# Altium footprint library Toi Library.PcbLib: 740 footprints (part 41 of 47)
Each footprint in its own frame and in the unit in brackets; x right, y up, seen from the top. Pads: shape width x height; smd on the part's side, far side on the other; paste and mask are expansions set on the pad; w line width, h text height; cw(c..) or ccw(c..) is an arc to the next point about the centre after c.
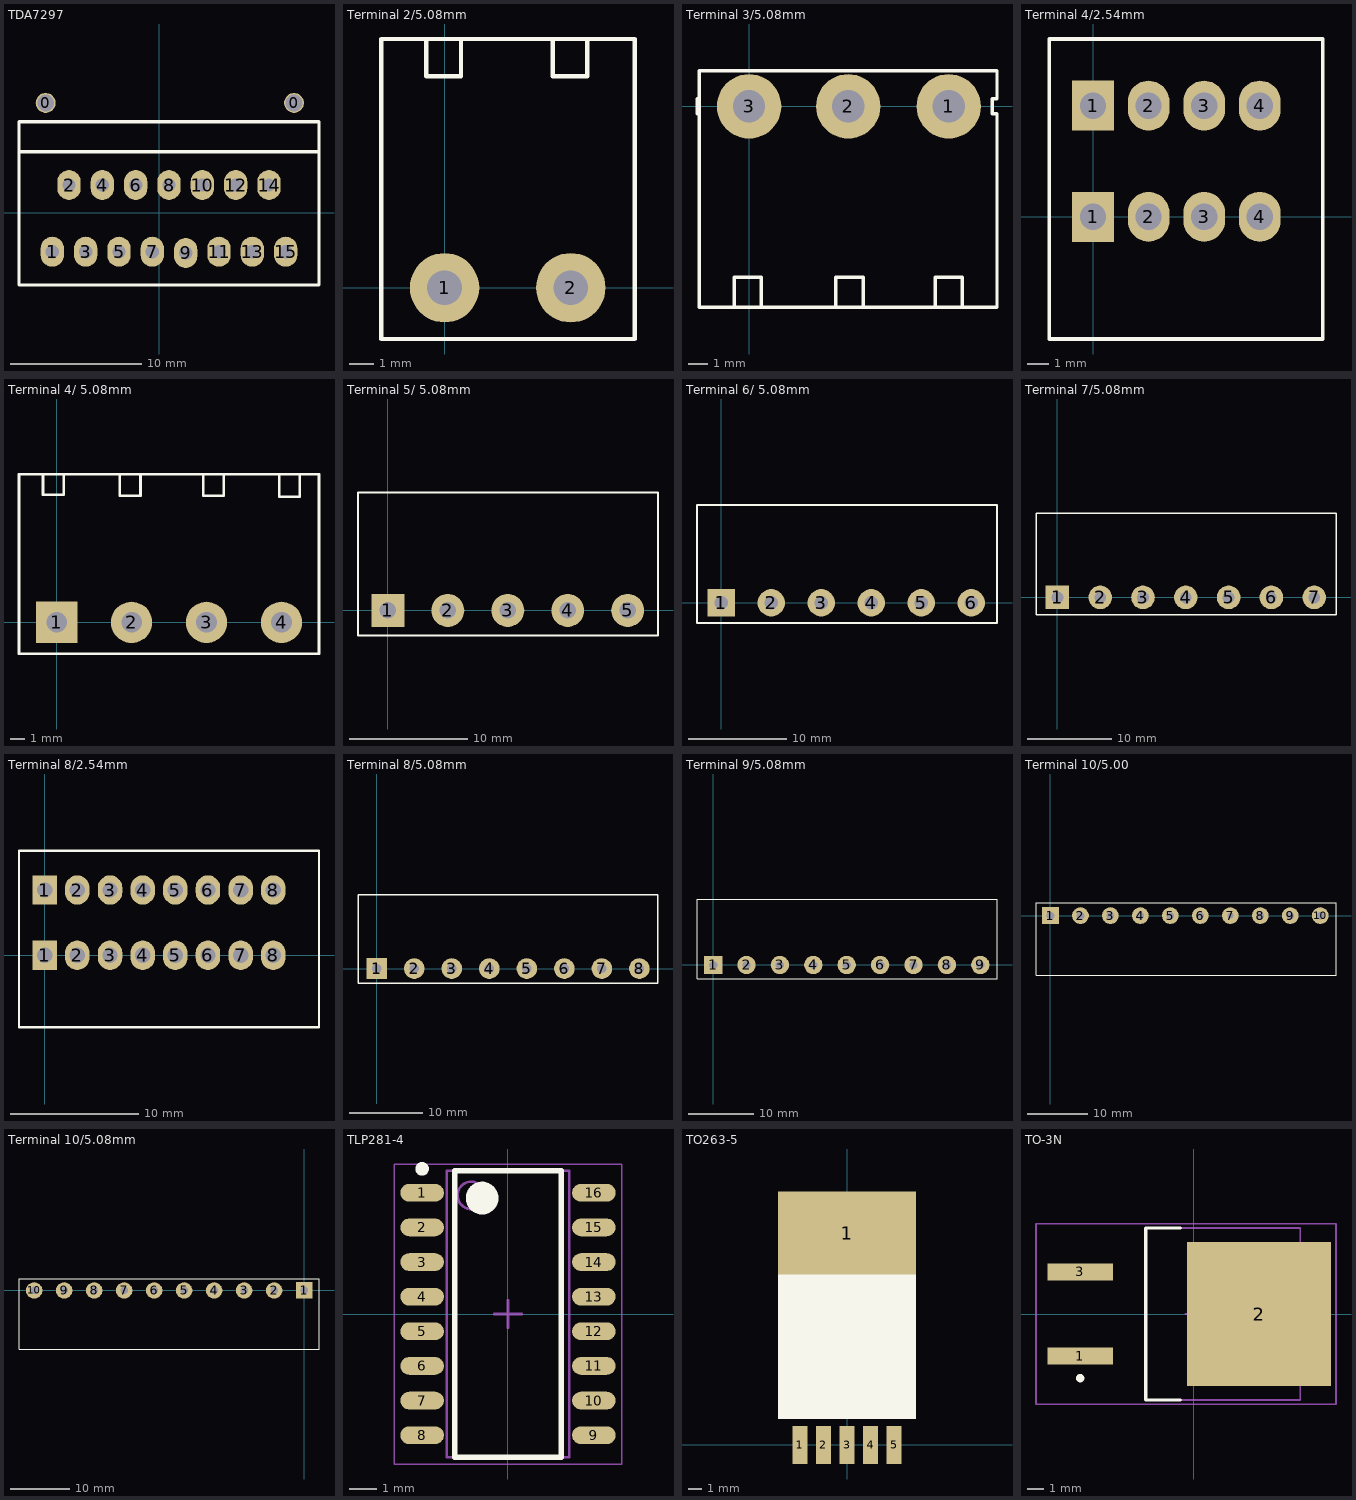
[diagram p40: the footprints below, top view; thin cyan lines are the x and y axes]

## TDA7297 [mil]
pads (17):
  round 60 hole 50: 0(-340,330) 0(405,330)
  oval 70x90 hole 40: 1(-320.08,-116.38) 2(-270.08,83.62) 3(-220.08,-116.38) 4(-170.08,83.62) 5(-120.08,-116.38) 6(-70.08,83.62) 7(-20.08,-116.38) 8(29.92,83.62) 9(79.92,-120) 10(129.92,83.62) 11(179.92,-116.38) 12(229.92,83.62) 13(279.92,-116.38) 14(329.92,83.62) 15(379.92,-116.38)
Top Overlay:
  lines w10: -420.08,183.62 -420.08,273.62 479.92,273.62 479.92,183.62 ; -420.08,183.62 479.92,183.62 ; -420.08,183.62 -420.08,-216.38 479.92,-216.38 479.92,183.62
3D body "User Library-Multiwatt15V.STEP": height 801.1, standoff -76.85, extent -355.83,-129.37 415.83,260
3D body "User Library-radiator_l298.STEP": height 984.25, standoff -157.48, extent -442.44,-34.92 502.44,595

## Terminal 2/5.08mm [mil]
pads (2):
  round 110 hole 55.12: 1(0,0) 2(200,0)
Top Overlay:
  lines w7: -28.92,390.16 -28.92,335.16 26.08,335.16 26.08,390.16 ; 171.08,390.16 171.08,335.16 226.08,335.16 226.08,390.16 ; -100.5,-81.2 -100.5,394 301.5,394 301.5,-81.2 -100.5,-81.2
3D body "User Library-MSTB 2,5-2-G-5,08 1770711.STEP": height 339.18, standoff -137.2, extent -99.5,-79 300.5,393.53

## Terminal 3/5.08mm [mil] "Header 3, 3 pin, hight 300mil, Pin to Pin 200, Colour Green"
height 300
pads (3):
  round 130 hole 65: 1(402.62,0) 2(200,0) 3(0,0)
Top Overlay:
  lines w7: -105,-15 -105,15 ; -30,-400 -30,-345 25,-345 25,-400 ; 175,-400 175,-345 230,-345 230,-400 ; 375,-400 375,-345 430,-345 430,-400 ; -100,-405 -100,71.6 500,71.6 500,15 490,15 490,-15 500,-15 500,-405 -100,-405
3D body "User Library-BigHeader 5EHDR_1P.step": height 124.02, standoff -366.97, extent 299,-404.22 495.85,68.22
3D body "User Library-BigHeader 5EHDR_1P.step": height 124.02, standoff -366.97, extent 102,-404 298.85,68.44
3D body "User Library-BigHeader 5EHDR_1P.step": height 124.02, standoff -366.97, extent -95,-404 101.85,68.44

## Terminal 4/2.54mm [mm]
pads (8):
  rect 1.905x2.286 hole 1.2: 1(0,0) 1(0,5.08)
  oval 1.905x2.286 hole 1.2: 2(2.54,0) 2(2.54,5.08) 3(5.08,0) 3(5.08,5.08) 4(7.62,0) 4(7.62,5.08)
Top Overlay:
  lines w0.178: -2,-5.588 10.5,-5.588 10.5,8.128 -2,8.128 -2,-5.588
3D body "70055115.stp": height 12.6, standoff -3.6, extent 6.858,-5.53 11.198,8.07
3D body "70055115.stp": height 12.6, standoff -3.6, extent 4.318,-5.53 8.658,8.07
3D body "70055115.stp": height 12.6, standoff -3.6, extent 1.778,-5.53 6.118,8.07
3D body "70055115.stp": height 12.6, standoff -3.6, extent -0.762,-5.53 3.578,8.07

## Terminal 4/ 5.08mm [mil]
pads (4):
  rect 110x110 hole 55.12: 1(0,0)
  round 110 hole 55.12: 2(200,0) 3(400,0) 4(600,0)
Top Overlay:
  lines w7: -36.3,395.08 -36.3,340.08 18.7,340.08 18.7,395.08 ; 168.62,392.62 168.62,337.62 223.62,337.62 223.62,392.62 ; 390.85,392.62 390.85,337.62 445.85,337.62 445.85,392.62 ; 593.62,390.16 593.62,335.16 648.62,335.16 648.62,390.16 ; -100.5,-83.66 -100.5,395 700,395 700,-83.66 -100.5,-83.66
3D body "User Library-MSTB 2,5-4-G-5,08 1759033.STEP": height 339.19, standoff -137.19, extent -99.5,-79 700.5,393.53

## Terminal 5/ 5.08mm [mil]
pads (5):
  rect 110x110 hole 55.12: 1(0,0)
  round 110 hole 55.12: 2(200,0) 3(400,0) 4(600,0) 5(800,0)
Top Overlay:
  lines w7: -99.5,-83.66 -99.5,393.5 898.5,393.5 901,393.5 901,-83.66 -99.5,-83.66
3D body "User Library-MSTB 2,5-5-G-5,08 1759046.STEP": height 339.18, standoff -137.2, extent -99.5,-78.77 900.5,393.77

## Terminal 6/ 5.08mm [mil]
pads (6):
  rect 110x110 hole 55.12: 1(0,0)
  round 110 hole 55.12: 2(200,0) 3(400,0) 4(600,0) 5(800,0) 6(1000,0)
Top Overlay:
  lines w7: -97,-81.2 1103,-81.2 1103,391.5 -97,391.5 -97,-81.2
3D body "User Library-MSTB 2,5-6-G-5,08 1759059.STEP": height 339.18, standoff -137.2, extent -99.5,-77.77 1100.5,394.77

## Terminal 7/5.08mm [mil]
pads (7):
  rect 110x110 hole 55.12: 1(0,0)
  round 110 hole 55.12: 2(200,0) 3(400,0) 4(600,0) 5(800,0) 7(1200,0)
  round 110 hole 50: 6(1000,0)
Top Overlay:
  lines w7: -100,-81.2 -100,393.5 1302,393.5 1302,-81.2 -100,-81.2
3D body "User Library-MSTB 2,5-7-G-5,08 1759062.STEP": height 339.18, standoff -137.2, extent -99.5,-79 1300.5,393.53

## Terminal 8/2.54mm [mm]
pads (16):
  rect 1.905x2.286 hole 1.2: 1(0,0) 1(0,5.08)
  oval 1.905x2.286 hole 1.2: 2(2.54,0) 2(2.54,5.08) 3(5.08,0) 3(5.08,5.08) 4(7.62,0) 4(7.62,5.08) 5(10.16,0) 5(10.16,5.08) 6(12.7,0) 6(12.7,5.08) 7(15.24,0) 7(15.24,5.08) 8(17.78,0) 8(17.78,5.08)
Top Overlay:
  lines w0.178: -2,-5.588 21.336,-5.588 21.336,8.128 -2,8.128 -2,-5.588
3D body "70055115.stp": height 12.6, standoff -3.6, extent 17.018,-5.53 21.358,8.07
3D body "70055115.stp": height 12.6, standoff -3.6, extent 14.478,-5.53 18.818,8.07
3D body "70055115.stp": height 12.6, standoff -3.6, extent 11.938,-5.53 16.278,8.07
3D body "70055115.stp": height 12.6, standoff -3.6, extent 9.398,-5.53 13.738,8.07
3D body "70055115.stp": height 12.6, standoff -3.6, extent 6.858,-5.53 11.198,8.07
3D body "70055115.stp": height 12.6, standoff -3.6, extent 4.318,-5.53 8.658,8.07
3D body "70055115.stp": height 12.6, standoff -3.6, extent 1.778,-5.53 6.118,8.07
3D body "70055115.stp": height 12.6, standoff -3.6, extent -0.762,-5.53 3.578,8.07

## Terminal 8/5.08mm [mil]
pads (8):
  rect 110x110 hole 50: 1(0,0)
  round 110 hole 50: 2(200,0) 3(400,0) 4(600,0) 5(800,0) 6(1000,0) 7(1200,0) 8(1400,0)
Top Overlay:
  lines w7: -100,-79.5 1499.5,-79.5 1499.5,394.5 -100,394.5 -100,-79.5
3D body "User Library-MSTB 2,5-8-G-5,08 1759075.STEP": height 339.18, standoff -137.2, extent -99.5,-78.5 1500.5,394.03

## Terminal 9/5.08mm [mil]
pads (9):
  rect 110x110 hole 50: 1(0,0)
  round 110 hole 50: 2(200,0) 3(400,0) 4(600,0) 5(800,0) 6(1000,0) 7(1200,0) 8(1400,0) 9(1600,0)
Top Overlay:
  lines w7: -96.5,-81.2 -96.5,392 1700,392 1700,-81.2 -96.5,-81.2
3D body "User Library-MSTB 2,5-9-G-5,08 1759088.STEP": height 339.18, standoff -137.2, extent -99.5,-79.5 1700.5,393.03

## Terminal 10/5.00 [mil]
pads (10):
  rect 110x110 hole 50: 1(0,0)
  round 110 hole 50: 2(196.85,0) 3(393.7,0) 4(590.55,0) 5(787.4,0) 6(984.25,0) 8(1377.95,0) 9(1574.8,0) 10(1771.65,0)
  round 110 hole 39.37: 7(1181.1,0)
Top Overlay:
  lines w7: -95,-391 1874.5,-391 1874.5,83.66 -95,83.66 -95,-391
3D body "User Library-MSTB 2,5-10-G 1754591.STEP": height 339.18, standoff -137.2, extent -94,-390.94 1874.5,81.5

## Terminal 10/5.08mm [mil]
pads (10):
  rect 110x110 hole 50: 1(0,0)
  round 110 hole 50: 2(-200,0) 3(-400,0) 4(-600,0) 5(-800,0) 6(-1000,0) 7(-1200,0) 8(-1400,0) 9(-1600,0) 10(-1800,0)
Top Overlay:
  lines w7: -1901,-393 -1901,79.5 99.5,79.5 99.5,-393 -1901,-393
3D body "User Library-MSTB 2,5-10-G-5,08 1759091.STEP": height 339.18, standoff -137.2, extent -1900.5,-393.03 99.5,79.5

## TLP281-4 [mm] "SOP, 16-Leads, Body 10.40x4.45mm, Pitch 1.27mm, IPC Medium Density"
height 2
pads (16):
  oval 1.6x0.65 smd: 1(-3.15,4.445) 2(-3.15,3.175) 3(-3.15,1.905) 4(-3.15,0.635) 5(-3.15,-0.635) 6(-3.15,-1.905) 7(-3.15,-3.175) 8(-3.15,-4.445) 9(3.15,-4.445) 10(3.15,-3.175) 11(3.15,-1.905) 12(3.15,-0.635) 13(3.15,0.635) 14(3.15,1.905) 15(3.15,3.175) 16(3.15,4.445)
Top Overlay:
  circle w0.6: c-0.95,4.25 r0.3
  circle w0.25: c-3.15,5.32 r0.125
  lines w0.2: -1.95,-5.25 1.95,-5.25 1.95,5.25 -1.95,5.25 -1.95,-5.25
Mechanical 13:
  circle w0.1: c-1.35,4.35 r0.5
  lines w0.1: -2.25,-5.25 2.25,-5.25 2.25,5.25 -2.25,5.25 -2.25,-5.25
Mechanical 15:
  lines w0.05: -4.175,-5.5 4.175,-5.5 4.175,5.5 -4.175,5.5 -4.175,-5.5
  lines w0.1: -0.5,0 0.5,0 ; 0,-0.5 0,0.5
3D body "TLP281-4.step": height 2, standoff 0, extent -3.5,-5.25 3.5,5.25

## TO263-5 [mm] "LM2576-SMD"
pads (6):
  rect 1.07x2.75 smd: 1(-3.4,-0.025) 2(-1.7,-0.025) 3(0,-0.025) 4(1.7,-0.025) 5(3.4,-0.025)
  rect 10x6 smd: 1(0,15.289)
Top Overlay:
  rectangle: -5,1.854 5,12.878
3D body "SW3dPS-TO263-5.STEP": height 4.79, standoff -0.01, extent -5,-0.381 5,15.289

## TO-3N [mm]
pads (3):
  rect 3.95x1.05 smd: 1(-6.858,-2.54) 3(-6.858,2.54)
  rect 8.7x8.7 smd: 2(3.95,0)
Top Overlay:
  circle w0.25: c-6.858,-3.878 r0.125
  lines w0.2: -0.8,-5.2 -2.9,-5.2 -2.9,5.2 -0.8,5.2
Mechanical 13:
  lines w0.1: -2.9,-5.2 6.45,-5.2 6.45,5.2 -2.9,5.2 -2.9,-5.2
Mechanical 15:
  lines w0.1: -0.5,0 0.5,0 ; 0,-0.5 0,0.5 ; -9.525,-5.45 8.6,-5.45 8.6,5.45 -9.525,5.45 -9.525,-5.45
3D body: height 4.6, standoff 0.45, extent -2.9,-5.2 6.45,5.2